# Altium footprint library IC.PcbLib: 163 footprints (part 6 of 11)
Each footprint in its own frame and in the unit in brackets; x right, y up, seen from the top. Pads: shape width x height; smd on the part's side, far side on the other; paste and mask are expansions set on the pad; w line width, h text height; cw(c..) or ccw(c..) is an arc to the next point about the centre after c.
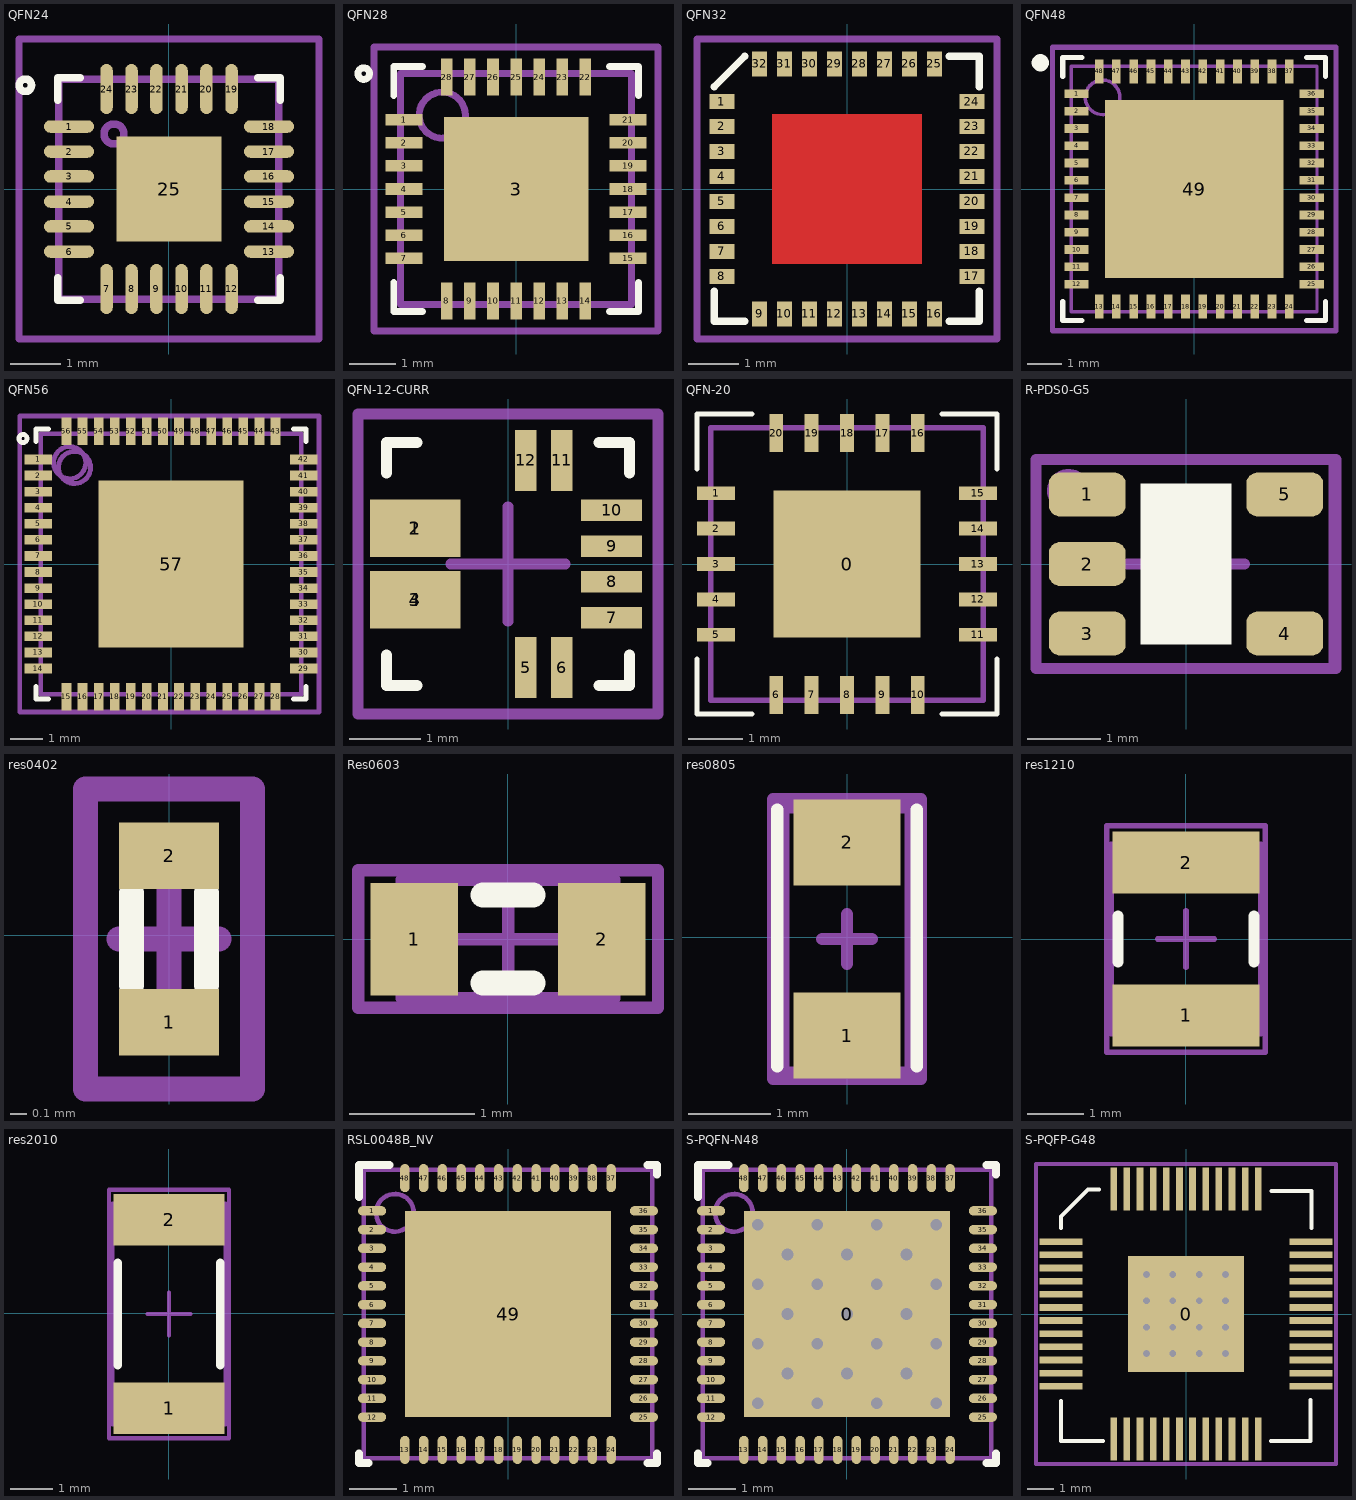
[diagram p5: the footprints below, top view; thin cyan lines are the x and y axes]

## QFN24 [mm] "QFN, 24-Leads, Body 4x4mm, Pitch 0.5mm, Thermal Pad 2.1x2.1mm, IPC Low Density"
height 1
pads (25):
  oval 1x0.25 smd: 1(-2,1.25) 2(-2,0.75) 3(-2,0.25) 4(-2,-0.25) 5(-2,-0.75) 6(-2,-1.25) 13(2,-1.25) 14(2,-0.75) 15(2,-0.25) 16(2,0.25) 17(2,0.75) 18(2,1.25)
  oval 0.25x1 smd: 7(-1.25,-2) 8(-0.75,-2) 9(-0.25,-2) 10(0.25,-2) 11(0.75,-2) 12(1.25,-2) 19(1.25,2) 20(0.75,2) 21(0.25,2) 22(-0.25,2) 23(-0.75,2) 24(-1.25,2)
  rect 2.1x2.1 smd: 25(0,0)
Top Overlay:
  circle w0.15: c-2.875,2.075 r0.125
  lines w0.15: -2.225,-1.775 -2.225,-2.225 -1.775,-2.225 ; -2.225,1.775 -2.225,2.225 -1.775,2.225 ; 1.775,-2.225 2.225,-2.225 2.225,-1.775 ; 1.775,2.225 2.225,2.225 2.225,1.775
Mechanical 15:
  lines w0.15: -0.5,0 0.5,0 ; 0,-0.5 0,0.5 ; -3,-3 3,-3 3,3 -3,3 -3,-3
Mechanical 29:
  circle w0.15: c-1.1,1.1 r0.2
  lines w0.15: -2.2,-2.2 -2.2,2.2 2.2,2.2 2.2,-2.2 -2.2,-2.2
  text ".Designator" at -2,-0.4 h1
3D body "User Library-LFCSP-24.step": height 0.83, standoff -0.02, extent -2,-2 2,2

## QFN28 [mm] "QFN, 28-Leads, Body 5,00x5,00mm, Pitch 0,50mm, Thermal Pad, IPC Medium Density"
height 1
pads (29):
  rect 0.8x0.25 smd: 1(-2.425,1.5) 2(-2.425,1) 3(-2.425,0.5) 4(-2.425,0) 5(-2.425,-0.5) 6(-2.425,-1) 7(-2.425,-1.5) 15(2.425,-1.5) 16(2.425,-1) 17(2.425,-0.5) 18(2.425,0) 19(2.425,0.5) 20(2.425,1) 21(2.425,1.5)
  rect 3.13x3.13 smd: 3(0,0)
  rect 0.25x0.8 smd: 8(-1.5,-2.425) 9(-1,-2.425) 10(-0.5,-2.425) 11(0,-2.425) 12(0.5,-2.425) 13(1,-2.425) 14(1.5,-2.425) 22(1.5,2.425) 23(1,2.425) 24(0.5,2.425) 25(0,2.425) 26(-0.5,2.425) 27(-1,2.425) 28(-1.5,2.425)
Top Overlay:
  circle w0.15: c-3.3,2.5 r0.125
  lines w0.15: -2.65,-2.025 -2.65,-2.65 -2.025,-2.65 ; -2.65,2.025 -2.65,2.65 -2.025,2.65 ; 2.025,-2.65 2.65,-2.65 2.65,-2.025 ; 2.025,2.65 2.65,2.65 2.65,2.025
Top Solder:
  rectangle: 0.7,1.1 1.3,1.4
  rectangle: 0.7,0.6 1.3,0.9
  rectangle: 0.7,0.1 1.3,0.4
  rectangle: 0.7,-0.4 1.3,-0.1
  rectangle: 0.7,-0.9 1.3,-0.6
  rectangle: 0.7,-1.4 1.3,-1.1
  rectangle: -0.3,1.1 0.3,1.4
  rectangle: -0.3,0.6 0.3,0.9
  rectangle: -0.3,0.1 0.3,0.4
  rectangle: -0.3,-0.4 0.3,-0.1
  rectangle: -0.3,-0.9 0.3,-0.6
  rectangle: -0.3,-1.4 0.3,-1.1
  rectangle: -1.3,-1.4 -0.7,-1.1
  rectangle: -1.3,-0.9 -0.7,-0.6
  rectangle: -1.3,-0.4 -0.7,-0.1
  rectangle: -1.3,0.1 -0.7,0.4
  rectangle: -1.3,0.6 -0.7,0.9
  rectangle: -1.3,1.1 -0.7,1.4
Mechanical 13:
  circle w0.15: c-1.6,1.6 r0.5
  lines w0.15: -2.5,-2.5 -2.5,2.5 2.5,2.5 2.5,-2.5 -2.5,-2.5
Mechanical 15:
  lines w0.15: -0.5,0 0.5,0 ; 0,-0.5 0,0.5 ; -3.075,-3.075 -3.075,3.075 3.075,3.075 3.075,-3.075 -3.075,-3.075
Mechanical 29:
  circle w0.15: c-1.6,1.6 r0.5
  lines w0.15: -2.5,-2.5 2.5,-2.5 2.5,2.5 -2.5,2.5 -2.5,-2.5
  text ".Designator" at -2.2,-0.5 h1
3D body "QFN-28.step": height 1, standoff 0, extent -2.52,-2.52 2.52,2.52

## QFN32 [mm]
pads (32):
  rect 0.5x0.3 smd: 1(-2.5,1.75) 2(-2.5,1.25) 3(-2.5,0.75) 4(-2.5,0.25) 5(-2.5,-0.25) 6(-2.5,-0.75) 7(-2.5,-1.25) 8(-2.5,-1.75) 17(2.5,-1.75) 18(2.5,-1.25) 19(2.5,-0.75) 20(2.5,-0.25) 21(2.5,0.25) 22(2.5,0.75) 23(2.5,1.25) 24(2.5,1.75)
  rect 0.3x0.5 smd: 9(-1.75,-2.5) 10(-1.25,-2.5) 11(-0.75,-2.5) 12(-0.25,-2.5) 13(0.25,-2.5) 14(0.75,-2.5) 15(1.25,-2.5) 16(1.75,-2.5) 25(1.75,2.5) 26(1.25,2.5) 27(0.75,2.5) 28(0.25,2.5) 29(-0.25,2.5) 30(-0.75,2.5) 31(-1.25,2.5) 32(-1.75,2.5)
Top Layer:
  rectangle: -1.5,-1.5 1.5,1.5
Top Overlay:
  lines w0.15: -2.65,-2.05 -2.65,-2.65 -2.05,-2.65 ; -2.65,2.05 -2.05,2.65 ; 2.05,-2.65 2.65,-2.65 2.65,-2.05 ; 2.05,2.65 2.65,2.65 2.65,2.05
  text "." at -2.675,2.65 h0.1
Mechanical 15:
  lines w0.15: -0.8,0 0,0 ; 0,-0.8 0,0 ; 0,0.8 0,0 ; 0.8,0 0,0 ; -3,-3 3,-3 3,3 -3,3 -3,-3

## QFN48 [mm] "QFN, 48-Leads, Body 7,00x7,00mm, Pitch 0,50mm, Thermal Pad 5,15x5,15mm, IPC Medium Density"
height 0.75
pads (49):
  rect 0.7x0.25 smd: 1(-3.4,2.75) 2(-3.4,2.25) 3(-3.4,1.75) 4(-3.4,1.25) 5(-3.4,0.75) 6(-3.4,0.25) 7(-3.4,-0.25) 8(-3.4,-0.75) 9(-3.4,-1.25) 10(-3.4,-1.75) 11(-3.4,-2.25) 12(-3.4,-2.75) 25(3.4,-2.75) 26(3.4,-2.25) 27(3.4,-1.75) 28(3.4,-1.25) 29(3.4,-0.75) 30(3.4,-0.25) 31(3.4,0.25) 32(3.4,0.75) 33(3.4,1.25) 34(3.4,1.75) 35(3.4,2.25) 36(3.4,2.75)
  rect 0.25x0.7 smd: 13(-2.75,-3.4) 14(-2.25,-3.4) 15(-1.75,-3.4) 16(-1.25,-3.4) 17(-0.75,-3.4) 18(-0.25,-3.4) 19(0.25,-3.4) 20(0.75,-3.4) 21(1.25,-3.4) 22(1.75,-3.4) 23(2.25,-3.4) 24(2.75,-3.4) 37(2.75,3.4) 38(2.25,3.4) 39(1.75,3.4) 40(1.25,3.4) 41(0.75,3.4) 42(0.25,3.4) 43(-0.25,3.4) 44(-0.75,3.4) 45(-1.25,3.4) 46(-1.75,3.4) 47(-2.25,3.4) 48(-2.75,3.4)
  rect 5.15x5.15 smd: 49(0,0)
Top Overlay:
  circle w0.25: c-4.45,3.65 r0.125
  lines w0.15: -3.8,-3.25 -3.8,-3.8 -3.25,-3.8 ; -3.8,3.25 -3.8,3.8 -3.25,3.8 ; 3.25,-3.8 3.8,-3.8 3.8,-3.25 ; 3.25,3.8 3.8,3.8 3.8,3.25
Mechanical 13:
  circle w0.1: c-2.65,2.65 r0.5
  lines w0.1: -3.55,-3.55 -3.55,3.55 3.55,3.55 3.55,-3.55 -3.55,-3.55
Mechanical 15:
  lines w0.15: -0.5,0 0.5,0 ; 0,-0.5 0,0.5 ; -4.1,-4.1 -4.1,4.1 4.1,4.1 4.1,-4.1 -4.1,-4.1
3D body "QFN48.step": height 0.75, standoff 0, extent -3.6,-3.6 3.6,3.6

## QFN56 [mm] "QFN, 56-Leads, Body 8,00x8,00mm, Pitch 0,50mm, Thermal Pad 4,50x5,20mm, IPC Medium Density"
height 1
pads (57):
  rect 0.85x0.3 smd: 1(-4.125,3.25) 2(-4.125,2.75) 3(-4.125,2.25) 4(-4.125,1.75) 5(-4.125,1.25) 6(-4.125,0.75) 7(-4.125,0.25) 8(-4.125,-0.25) 9(-4.125,-0.75) 10(-4.125,-1.25) 11(-4.125,-1.75) 12(-4.125,-2.25) 13(-4.125,-2.75) 14(-4.125,-3.25) 29(4.125,-3.25) 30(4.125,-2.75) 31(4.125,-2.25) 32(4.125,-1.75) 33(4.125,-1.25) 34(4.125,-0.75) 35(4.125,-0.25) 36(4.125,0.25) 37(4.125,0.75) 38(4.125,1.25) 39(4.125,1.75) 40(4.125,2.25) 41(4.125,2.75) 42(4.125,3.25)
  rect 0.3x0.85 smd: 15(-3.25,-4.125) 16(-2.75,-4.125) 17(-2.25,-4.125) 18(-1.75,-4.125) 19(-1.25,-4.125) 20(-0.75,-4.125) 21(-0.25,-4.125) 22(0.25,-4.125) 23(0.75,-4.125) 24(1.25,-4.125) 25(1.75,-4.125) 26(2.25,-4.125) 27(2.75,-4.125) 28(3.25,-4.125) 43(3.25,4.125) 44(2.75,4.125) 45(2.25,4.125) 46(1.75,4.125) 47(1.25,4.125) 48(0.75,4.125) 49(0.25,4.125) 50(-0.25,4.125) 51(-0.75,4.125) 52(-1.25,4.125) 53(-1.75,4.125) 54(-2.25,4.125) 55(-2.75,4.125) 56(-3.25,4.125)
  rect 4.5x5.2 smd: 57(0,0)
Top Overlay:
  circle w0.15: c-4.6,3.9 r0.125
  lines w0.15: -4.2,-3.8 -4.2,-4.2 -3.8,-4.2 ; -4.2,3.8 -4.2,4.2 -3.8,4.2 ; 3.8,-4.2 4.2,-4.2 4.2,-3.8 ; 3.8,4.2 4.2,4.2 4.2,3.8
Mechanical 13:
  circle w0.15: c-3.15,3.15 r0.5
Mechanical 15:
  lines w0.15: -0.5,0 0.5,0 ; -4.7,-4.6 -4.7,4.6 4.6,4.6 4.6,-4.6 -4.7,-4.6
Mechanical 29:
  circle w0.15: c-3,3 r0.5
  lines w0.15: -4.05,-4.05 -4.05,4.05 4.05,4.05 4.05,-4.05 -4.05,-4.05
  text ".Designator" at -3.5,-0.4 h1

## QFN-12-CURR [mm] "QFN, 12-Contact  With Fused Sensed Current Loop"
height 0.9
pads (12):
  rect 1.27x0.8 smd: 1(-1.3,0.5) 2(-1.3,0.5) 3(-1.3,-0.5) 4(-1.3,-0.5)
  rect 0.3x0.85 smd: 5(0.25,-1.45) 6(0.75,-1.45) 11(0.75,1.45) 12(0.25,1.45)
  rect 0.85x0.3 smd: 7(1.45,-0.75) 8(1.45,-0.25) 9(1.45,0.25) 10(1.45,0.75)
Top Overlay:
  lines w0.15: -1.7,-1.275 -1.7,-1.7 -1.275,-1.7 ; -1.7,1.275 -1.7,1.7 -1.275,1.7 ; 1.275,-1.7 1.7,-1.7 1.7,-1.275 ; 1.275,1.7 1.7,1.7 1.7,1.275
  text "." at -2.2,1.575 h0.1
Mechanical 15:
  lines w0.15: -0.8,0 0,0 ; 0,-0.8 0,0 ; 0,0.8 0,0 ; 0.8,0 0,0 ; -2.1,-2.1 -2.1,2.1 2.1,2.1 2.1,-2.1 -2.1,-2.1
3D body "QFN16.STEP": height 0.89, standoff 0, extent -1.55,-1.55 1.55,1.55

## QFN-20 [mm]
pads (21):
  rect 2.7x2.7 smd: 0(0,0)
  rect 0.7x0.25 smd: 1(-2.4,1.3) 2(-2.4,0.65) 3(-2.4,0) 4(-2.4,-0.65) 5(-2.4,-1.3) 11(2.4,-1.3) 12(2.4,-0.65) 13(2.4,0) 14(2.4,0.65) 15(2.4,1.3)
  rect 0.25x0.7 smd: 6(-1.3,-2.4) 7(-0.65,-2.4) 8(0,-2.4) 9(0.65,-2.4) 10(1.3,-2.4) 16(1.3,2.4) 17(0.65,2.4) 18(0,2.4) 19(-0.65,2.4) 20(-1.3,2.4)
Top Overlay:
  lines w0.1: -2.75,-1.75 -2.75,-2.75 -1.75,-2.75 ; -2.75,1.75 -2.75,2.75 -1.75,2.75 ; 1.75,-2.75 2.75,-2.75 2.75,-1.75 ; 1.75,2.75 2.75,2.75 2.75,1.75
Mechanical 32:
  lines w0.1: -0.5,0 0.5,0 ; 0,-0.5 0,0.5 ; -2.5,-2.5 2.5,-2.5 2.5,2.5 -2.5,2.5 -2.5,-2.5
3D body: height 0.75, standoff 0.05, extent -2.5,-2.5 2.5,2.5

## R-PDS0-G5 [mm]
pads (5):
  rrect50% 1.05x0.6 smd: 1(-1.35,0.95) 2(-1.35,0) 3(-1.35,-0.95) 4(1.35,-0.95) 5(1.35,0.95)
Top Overlay:
  rectangle: -0.625,-1.1 0.625,1.1
  text "." at -2.275,0.975 h0.1
Mechanical 13:
  circle w0.15: c-0.27,0.695 r0.175
Mechanical 15:
  lines w0.15: -0.8,0 0,0 ; 0,-0.8 0,0 ; 0,0.8 0,0 ; 0.8,0 0,0 ; -2.05,-1.425 -2.05,1.425 2.05,1.425 2.05,-1.425 -2.05,-1.425
Mechanical 29:
  circle w0.15: c-1.6,1 r0.224
  lines w0.15: -2.05,-1.425 2.025,-1.425 2.025,1.425 -2.05,1.425 -2.05,-1.425
  text ".Designator" at -1.9,-0.5 h1
3D body: height 1.1, standoff 0, extent -1.2,-1.1 1.2,1.1

## res0402 [mm]
pads (2):
  rect 0.6x0.4 smd: 1(0,-0.522) 2(0,0.478)
Top Overlay:
  lines w0.15: -0.225,-0.297 -0.225,0.253 ; 0.225,-0.297 0.225,0.253
Mechanical 15:
  lines w0.15: -0.3,-0.022 0.3,-0.022 ; 0,-0.322 0,0.278 ; -0.5,-0.922 -0.5,0.878 0.5,0.878 0.5,-0.922 -0.5,-0.922
3D body "0402R.STEP": height 0.34, standoff 0, extent -0.3,-0.542 0.3,0.498

## Res0603 [mm]
pads (2):
  rect 0.7x0.9 smd: 1(-0.75,0) 2(0.75,0)
Top Overlay:
  lines w0.2: -0.2,-0.35 0.2,-0.35 ; -0.2,0.35 0.2,0.35
Mechanical 13:
  lines w0.1: -0.85,-0.475 -0.85,0.475 0.85,0.475 0.85,-0.475 -0.85,-0.475
Mechanical 15:
  lines w0.1: -0.475,0 0.475,0 ; 0,-0.475 0,0.475 ; -1.2,-0.55 -1.2,0.55 1.2,0.55 1.2,-0.55 -1.2,-0.55
3D body: height 0.9, standoff 0, extent -0.85,-0.475 0.85,0.475

## res0805 [mm]
pads (2):
  rect 1.3x1.05 smd: 1(0,-1.197) 2(0,1.153)
Top Overlay:
  lines w0.15: -0.85,-1.572 -0.85,1.553 ; 0.85,-1.572 0.85,1.553
Mechanical 15:
  lines w0.15: -0.3,-0.022 0.3,-0.022 ; 0,-0.322 0,0.278 ; -0.9,-1.722 -0.9,1.678 0.9,1.678 0.9,-1.722 -0.9,-1.722
Mechanical 29:
  lines w0.15: -0.775,-1.647 0.775,-1.647 0.775,1.578 -0.775,1.578 -0.775,-1.647
3D body: height 0.5, standoff 0, extent -0.6,0.378 0.6,0.978
3D body: height 0.5, standoff 0, extent -0.6,-0.422 0.6,0.378
3D body: height 0.5, standoff 0, extent -0.6,-1.022 0.6,-0.422

## res1210 [mm]
pads (2):
  rect 2.6x1.1 smd: 1(0.005,-1.35) 2(0.005,1.35)
Top Overlay:
  lines w0.2: -1.195,-0.4 -1.195,0.4 ; 1.205,-0.4 1.205,0.4
Mechanical 13:
  lines w0.1: -1.315,-1.675 -1.315,1.675 1.325,1.675 1.325,-1.675 -1.315,-1.675
Mechanical 15:
  lines w0.1: -0.495,0 0.505,0 ; 0.005,-0.5 0.005,0.5 ; -1.395,-2 -1.395,2 1.405,2 1.405,-2 -1.395,-2
3D body: height 0.9, standoff 0, extent -1.315,-1.675 1.325,1.675

## res2010 [mm]
pads (2):
  rect 2.6x1.2 smd: 1(0.005,-2.222) 2(0.005,2.178)
Top Overlay:
  lines w0.2: -1.195,-1.222 -1.195,1.178 ; 1.205,-1.222 1.205,1.178
Mechanical 13:
  lines w0.1: -1.32,-2.597 1.33,-2.597 1.33,2.553 -1.32,2.553 -1.32,-2.597
Mechanical 15:
  lines w0.1: -0.495,-0.022 0.505,-0.022 ; 0.005,-0.522 0.005,0.478 ; -1.395,-2.922 1.405,-2.922 1.405,2.878 -1.395,2.878 -1.395,-2.922
3D body: height 0.9, standoff 0, extent -1.32,-2.597 1.33,2.553

## RSL0048B_NV [mm]
height 1
pads (49):
  oval 0.6x0.2 smd: 1(-2.9,2.2) 2(-2.9,1.8) 3(-2.9,1.4) 4(-2.9,1) 5(-2.9,0.6) 6(-2.9,0.2) 7(-2.9,-0.2) 8(-2.9,-0.6) 9(-2.9,-1) 10(-2.9,-1.4) 11(-2.9,-1.8) 12(-2.9,-2.2) 25(2.9,-2.2) 26(2.9,-1.8) 27(2.9,-1.4) 28(2.9,-1) 29(2.9,-0.6) 30(2.9,-0.2) 31(2.9,0.2) 32(2.9,0.6) 33(2.9,1) 34(2.9,1.4) 35(2.9,1.8) 36(2.9,2.2)
  oval 0.2x0.6 smd: 13(-2.2,-2.9) 14(-1.8,-2.9) 15(-1.4,-2.9) 16(-1,-2.9) 17(-0.6,-2.9) 18(-0.2,-2.9) 19(0.2,-2.9) 20(0.6,-2.9) 21(1,-2.9) 22(1.4,-2.9) 23(1.8,-2.9) 24(2.2,-2.9) 37(2.2,2.9) 38(1.8,2.9) 39(1.4,2.9) 40(1,2.9) 41(0.6,2.9) 42(0.2,2.9) 43(-0.2,2.9) 44(-0.6,2.9) 45(-1,2.9) 46(-1.4,2.9) 47(-1.8,2.9) 48(-2.2,2.9)
  rect 4.4x4.4 smd paste-2.2: 49(0,0)
Top Overlay:
  lines w0.17: -3.175,-2.975 -3.175,-3.175 -2.975,-3.175 ; -3.175,2.5 -3.175,3.175 -2.525,3.175 ; 2.975,-3.175 3.175,-3.175 3.175,-2.975 ; 2.975,3.175 3.175,3.175 3.175,2.975
Top Paste:
  rectangle: 0.1,0.1 1.946,1.946
  rectangle: 0.1,-1.946 1.946,-0.1
  rectangle: -1.946,0.1 -0.1,1.946
  rectangle: -1.946,-1.946 -0.1,-0.1
Mechanical 5:
  circle w0.1: c-2.413,2.159 r0.402
  lines w0.1: -3.075,-3.075 3.075,-3.075 3.075,3.075 -3.075,3.075 -3.075,-3.075 ; -3.075,-2.33 -3.075,-2.07 -3.075,-2.33 ; -3.075,-1.93 -3.075,-1.67 -3.075,-1.93 ; -3.075,-1.53 -3.075,-1.27 -3.075,-1.53 ; -3.075,-1.13 -3.075,-0.87 -3.075,-1.13 ; -3.075,-0.73 -3.075,-0.47 -3.075,-0.73 ; -3.075,-0.33 -3.075,-0.07 -3.075,-0.33 ; -3.075,0.07 -3.075,0.33 -3.075,0.07 ; -3.075,0.47 -3.075,0.73 -3.075,0.47 ; -3.075,0.87 -3.075,1.13 -3.075,0.87 ; -3.075,1.27 -3.075,1.53 -3.075,1.27 ; -3.075,1.67 -3.075,1.93 -3.075,1.67 ; -3.075,2.07 -3.075,2.33 -3.075,2.07 ; -2.33,-3.075 -2.07,-3.075 -2.33,-3.075 ; -2.33,3.075 -2.07,3.075 -2.33,3.075 ; -1.93,-3.075 -1.67,-3.075 -1.93,-3.075 ; -1.93,3.075 -1.67,3.075 -1.93,3.075 ; -1.53,-3.075 -1.27,-3.075 -1.53,-3.075 ; -1.53,3.075 -1.27,3.075 -1.53,3.075 ; -1.13,-3.075 -0.87,-3.075 -1.13,-3.075 ; -1.13,3.075 -0.87,3.075 -1.13,3.075 ; -0.73,-3.075 -0.47,-3.075 -0.73,-3.075 ; -0.73,3.075 -0.47,3.075 -0.73,3.075 ; -0.33,-3.075 -0.07,-3.075 -0.33,-3.075 ; -0.33,3.075 -0.07,3.075 -0.33,3.075 ; 0.07,-3.075 0.33,-3.075 0.07,-3.075 ; 0.07,3.075 0.33,3.075 0.07,3.075 ; 0.47,-3.075 0.73,-3.075 0.47,-3.075 ; 0.47,3.075 0.73,3.075 0.47,3.075 ; 0.87,-3.075 1.13,-3.075 0.87,-3.075 ; 0.87,3.075 1.13,3.075 0.87,3.075 ; 1.27,-3.075 1.53,-3.075 1.27,-3.075 ; 1.27,3.075 1.53,3.075 1.27,3.075 ; 1.67,-3.075 1.93,-3.075 1.67,-3.075 ; 1.67,3.075 1.93,3.075 1.67,3.075 ; 2.07,-3.075 2.33,-3.075 2.07,-3.075 ; 2.07,3.075 2.33,3.075 2.07,3.075 ; 3.075,-2.33 3.075,-2.07 3.075,-2.33 ; 3.075,-1.93 3.075,-1.67 3.075,-1.93 ; 3.075,-1.53 3.075,-1.27 3.075,-1.53 ; 3.075,-1.13 3.075,-0.87 3.075,-1.13 ; 3.075,-0.73 3.075,-0.47 3.075,-0.73 ; 3.075,-0.33 3.075,-0.07 3.075,-0.33 ; 3.075,0.07 3.075,0.33 3.075,0.07 ; 3.075,0.47 3.075,0.73 3.075,0.47 ; 3.075,0.87 3.075,1.13 3.075,0.87 ; 3.075,1.27 3.075,1.53 3.075,1.27 ; 3.075,1.67 3.075,1.93 3.075,1.67 ; 3.075,2.07 3.075,2.33 3.075,2.07
3D body: height 1, standoff 0, extent -3.074,-3.074 3.074,3.074
3D body: height 1.01, standoff 0, extent -2.814,1.758 -2.012,2.56

## S-PQFN-N48 [mm]
height 1
pads (49):
  rect 4.4x4.4 smd paste-2.2: 0(0,0)
  oval 0.6x0.2 smd: 1(-2.9,2.2) 2(-2.9,1.8) 3(-2.9,1.4) 4(-2.9,1) 5(-2.9,0.6) 6(-2.9,0.2) 7(-2.9,-0.2) 8(-2.9,-0.6) 9(-2.9,-1) 10(-2.9,-1.4) 11(-2.9,-1.8) 12(-2.9,-2.2) 25(2.9,-2.2) 26(2.9,-1.8) 27(2.9,-1.4) 28(2.9,-1) 29(2.9,-0.6) 30(2.9,-0.2) 31(2.9,0.2) 32(2.9,0.6) 33(2.9,1) 34(2.9,1.4) 35(2.9,1.8) 36(2.9,2.2)
  oval 0.2x0.6 smd: 13(-2.2,-2.9) 14(-1.8,-2.9) 15(-1.4,-2.9) 16(-1,-2.9) 17(-0.6,-2.9) 18(-0.2,-2.9) 19(0.2,-2.9) 20(0.6,-2.9) 21(1,-2.9) 22(1.4,-2.9) 23(1.8,-2.9) 24(2.2,-2.9) 37(2.2,2.9) 38(1.8,2.9) 39(1.4,2.9) 40(1,2.9) 41(0.6,2.9) 42(0.2,2.9) 43(-0.2,2.9) 44(-0.6,2.9) 45(-1,2.9) 46(-1.4,2.9) 47(-1.8,2.9) 48(-2.2,2.9)
via 1.27,1.27 diameter 0.5 hole 0.25
via 0.635,0.635 diameter 0.5 hole 0.25
via -0.635,0.635 diameter 0.5 hole 0.25
via 0,1.27 diameter 0.5 hole 0.25
via -1.27,1.27 diameter 0.5 hole 0.25
via -1.27,-1.27 diameter 0.5 hole 0.25
via 0,-1.27 diameter 0.5 hole 0.25
via 1.27,-1.27 diameter 0.5 hole 0.25
via -0.635,-0.635 diameter 0.5 hole 0.25
via 0.635,-0.635 diameter 0.5 hole 0.25
via 1.27,0 diameter 0.5 hole 0.25
via 0,0 diameter 0.5 hole 0.25
via -1.27,0 diameter 0.5 hole 0.25
via -1.905,1.905 diameter 0.5 hole 0.25
via -0.635,1.905 diameter 0.5 hole 0.25
via 0.635,1.905 diameter 0.5 hole 0.25
via 1.905,1.905 diameter 0.5 hole 0.25
via 1.905,0.635 diameter 0.5 hole 0.25
via 1.905,-0.635 diameter 0.5 hole 0.25
via 1.905,-1.905 diameter 0.5 hole 0.25
via 0.635,-1.905 diameter 0.5 hole 0.25
via -0.635,-1.905 diameter 0.5 hole 0.25
via -1.905,-1.905 diameter 0.5 hole 0.25
via -1.905,-0.635 diameter 0.5 hole 0.25
via -1.905,0.635 diameter 0.5 hole 0.25
Top Layer:
  lines w0.203: -3.01,0.61 -3,0.6
Top Overlay:
  lines w0.17: -3.175,-2.975 -3.175,-3.175 -2.975,-3.175 ; -3.175,2.5 -3.175,3.175 -2.525,3.175 ; 2.975,-3.175 3.175,-3.175 3.175,-2.975 ; 2.975,3.175 3.175,3.175 3.175,2.975
Top Paste:
  rectangle: 0.1,0.1 1.946,1.946
  rectangle: 0.1,-1.946 1.946,-0.1
  rectangle: -1.946,0.1 -0.1,1.946
  rectangle: -1.946,-1.946 -0.1,-0.1
Mechanical 5:
  circle w0.1: c-2.413,2.159 r0.402
  lines w0.1: -3.075,-3.075 3.075,-3.075 3.075,3.075 -3.075,3.075 -3.075,-3.075 ; -3.075,-2.33 -3.075,-2.07 -3.075,-2.33 ; -3.075,-1.93 -3.075,-1.67 -3.075,-1.93 ; -3.075,-1.53 -3.075,-1.27 -3.075,-1.53 ; -3.075,-1.13 -3.075,-0.87 -3.075,-1.13 ; -3.075,-0.73 -3.075,-0.47 -3.075,-0.73 ; -3.075,-0.33 -3.075,-0.07 -3.075,-0.33 ; -3.075,0.07 -3.075,0.33 -3.075,0.07 ; -3.075,0.47 -3.075,0.73 -3.075,0.47 ; -3.075,0.87 -3.075,1.13 -3.075,0.87 ; -3.075,1.27 -3.075,1.53 -3.075,1.27 ; -3.075,1.67 -3.075,1.93 -3.075,1.67 ; -3.075,2.07 -3.075,2.33 -3.075,2.07 ; -2.33,-3.075 -2.07,-3.075 -2.33,-3.075 ; -2.33,3.075 -2.07,3.075 -2.33,3.075 ; -1.93,-3.075 -1.67,-3.075 -1.93,-3.075 ; -1.93,3.075 -1.67,3.075 -1.93,3.075 ; -1.53,-3.075 -1.27,-3.075 -1.53,-3.075 ; -1.53,3.075 -1.27,3.075 -1.53,3.075 ; -1.13,-3.075 -0.87,-3.075 -1.13,-3.075 ; -1.13,3.075 -0.87,3.075 -1.13,3.075 ; -0.73,-3.075 -0.47,-3.075 -0.73,-3.075 ; -0.73,3.075 -0.47,3.075 -0.73,3.075 ; -0.33,-3.075 -0.07,-3.075 -0.33,-3.075 ; -0.33,3.075 -0.07,3.075 -0.33,3.075 ; 0.07,-3.075 0.33,-3.075 0.07,-3.075 ; 0.07,3.075 0.33,3.075 0.07,3.075 ; 0.47,-3.075 0.73,-3.075 0.47,-3.075 ; 0.47,3.075 0.73,3.075 0.47,3.075 ; 0.87,-3.075 1.13,-3.075 0.87,-3.075 ; 0.87,3.075 1.13,3.075 0.87,3.075 ; 1.27,-3.075 1.53,-3.075 1.27,-3.075 ; 1.27,3.075 1.53,3.075 1.27,3.075 ; 1.67,-3.075 1.93,-3.075 1.67,-3.075 ; 1.67,3.075 1.93,3.075 1.67,3.075 ; 2.07,-3.075 2.33,-3.075 2.07,-3.075 ; 2.07,3.075 2.33,3.075 2.07,3.075 ; 3.075,-2.33 3.075,-2.07 3.075,-2.33 ; 3.075,-1.93 3.075,-1.67 3.075,-1.93 ; 3.075,-1.53 3.075,-1.27 3.075,-1.53 ; 3.075,-1.13 3.075,-0.87 3.075,-1.13 ; 3.075,-0.73 3.075,-0.47 3.075,-0.73 ; 3.075,-0.33 3.075,-0.07 3.075,-0.33 ; 3.075,0.07 3.075,0.33 3.075,0.07 ; 3.075,0.47 3.075,0.73 3.075,0.47 ; 3.075,0.87 3.075,1.13 3.075,0.87 ; 3.075,1.27 3.075,1.53 3.075,1.27 ; 3.075,1.67 3.075,1.93 3.075,1.67 ; 3.075,2.07 3.075,2.33 3.075,2.07
3D body: height 1, standoff 0, extent -3.074,-3.074 3.074,3.074
3D body: height 1.01, standoff 0, extent -2.814,1.758 -2.012,2.56

## S-PQFP-G48 [mm]
height 1
pads (49):
  rect 4.4x4.4 smd: 0(0,0)
  rect 1.65x0.254 smd: 1(-4.75,2.75) 2(-4.75,2.25) 3(-4.75,1.75) 4(-4.75,1.25) 5(-4.75,0.75) 6(-4.75,0.25) 7(-4.75,-0.25) 8(-4.75,-0.75) 9(-4.75,-1.25) 10(-4.75,-1.75) 11(-4.75,-2.25) 12(-4.75,-2.75) 25(4.75,-2.75) 26(4.75,-2.25) 27(4.75,-1.75) 28(4.75,-1.25) 29(4.75,-0.75) 30(4.75,-0.25) 31(4.75,0.25) 32(4.75,0.75) 33(4.75,1.25) 34(4.75,1.75) 35(4.75,2.25) 36(4.75,2.75)
  rect 0.254x1.65 smd: 13(-2.75,-4.75) 14(-2.25,-4.75) 15(-1.75,-4.75) 16(-1.25,-4.75) 17(-0.75,-4.75) 18(-0.25,-4.75) 19(0.25,-4.75) 20(0.75,-4.75) 21(1.25,-4.75) 22(1.75,-4.75) 23(2.25,-4.75) 24(2.75,-4.75) 37(2.75,4.75) 38(2.25,4.75) 39(1.75,4.75) 40(1.25,4.75) 41(0.75,4.75) 42(0.25,4.75) 43(-0.25,4.75) 44(-0.75,4.75) 45(-1.25,4.75) 46(-1.75,4.75) 47(-2.25,4.75) 48(-2.75,4.75)
via -1.5,1.5 diameter 0.5 hole 0.25
via -1.5,0.5 diameter 0.5 hole 0.25
via -0.5,1.5 diameter 0.5 hole 0.25
via -0.5,0.5 diameter 0.5 hole 0.25
via 1.5,-1.5 diameter 0.5 hole 0.25
via 1.5,-0.5 diameter 0.5 hole 0.25
via 0.5,-1.5 diameter 0.5 hole 0.25
via 0.5,-0.5 diameter 0.5 hole 0.25
via 1.5,1.5 diameter 0.5 hole 0.25
via 0.5,1.5 diameter 0.5 hole 0.25
via 1.5,0.5 diameter 0.5 hole 0.25
via 0.5,0.5 diameter 0.5 hole 0.25
via -1.5,-1.5 diameter 0.5 hole 0.25
via -0.5,-1.5 diameter 0.5 hole 0.25
via -1.5,-0.5 diameter 0.5 hole 0.25
via -0.5,-0.5 diameter 0.5 hole 0.25
Top Overlay:
  lines w0.15: -4.75,-3.3 -4.75,-4.825 -3.15,-4.825 ; -4.75,3.275 -4.75,3.7 -3.725,4.725 -3.3,4.725 ; 3.225,-4.825 4.725,-4.825 4.725,-3.275 ; 3.25,4.675 4.775,4.675 4.775,3.275
Mechanical 15:
  lines w0.15: -0.8,0 0,0 ; 0,-0.8 0,0 ; 0,0.8 0,0 ; 0.8,0 0,0 ; -5.7,-5.7 5.7,-5.7 5.7,5.7 -5.7,5.7 -5.7,-5.7
3D body "User Library-Quad50M48.step": height 1.56, standoff 0, extent -4.5,-4.511 4.5,4.489